# Altium footprint library Horizont_11_12_2017.PcbLib: 257 footprints (part 2 of 17)
Each footprint in its own frame and in the unit in brackets; x right, y up, seen from the top. Pads: shape width x height; smd on the part's side, far side on the other; paste and mask are expansions set on the pad; w line width, h text height; cw(c..) or ccw(c..) is an arc to the next point about the centre after c.
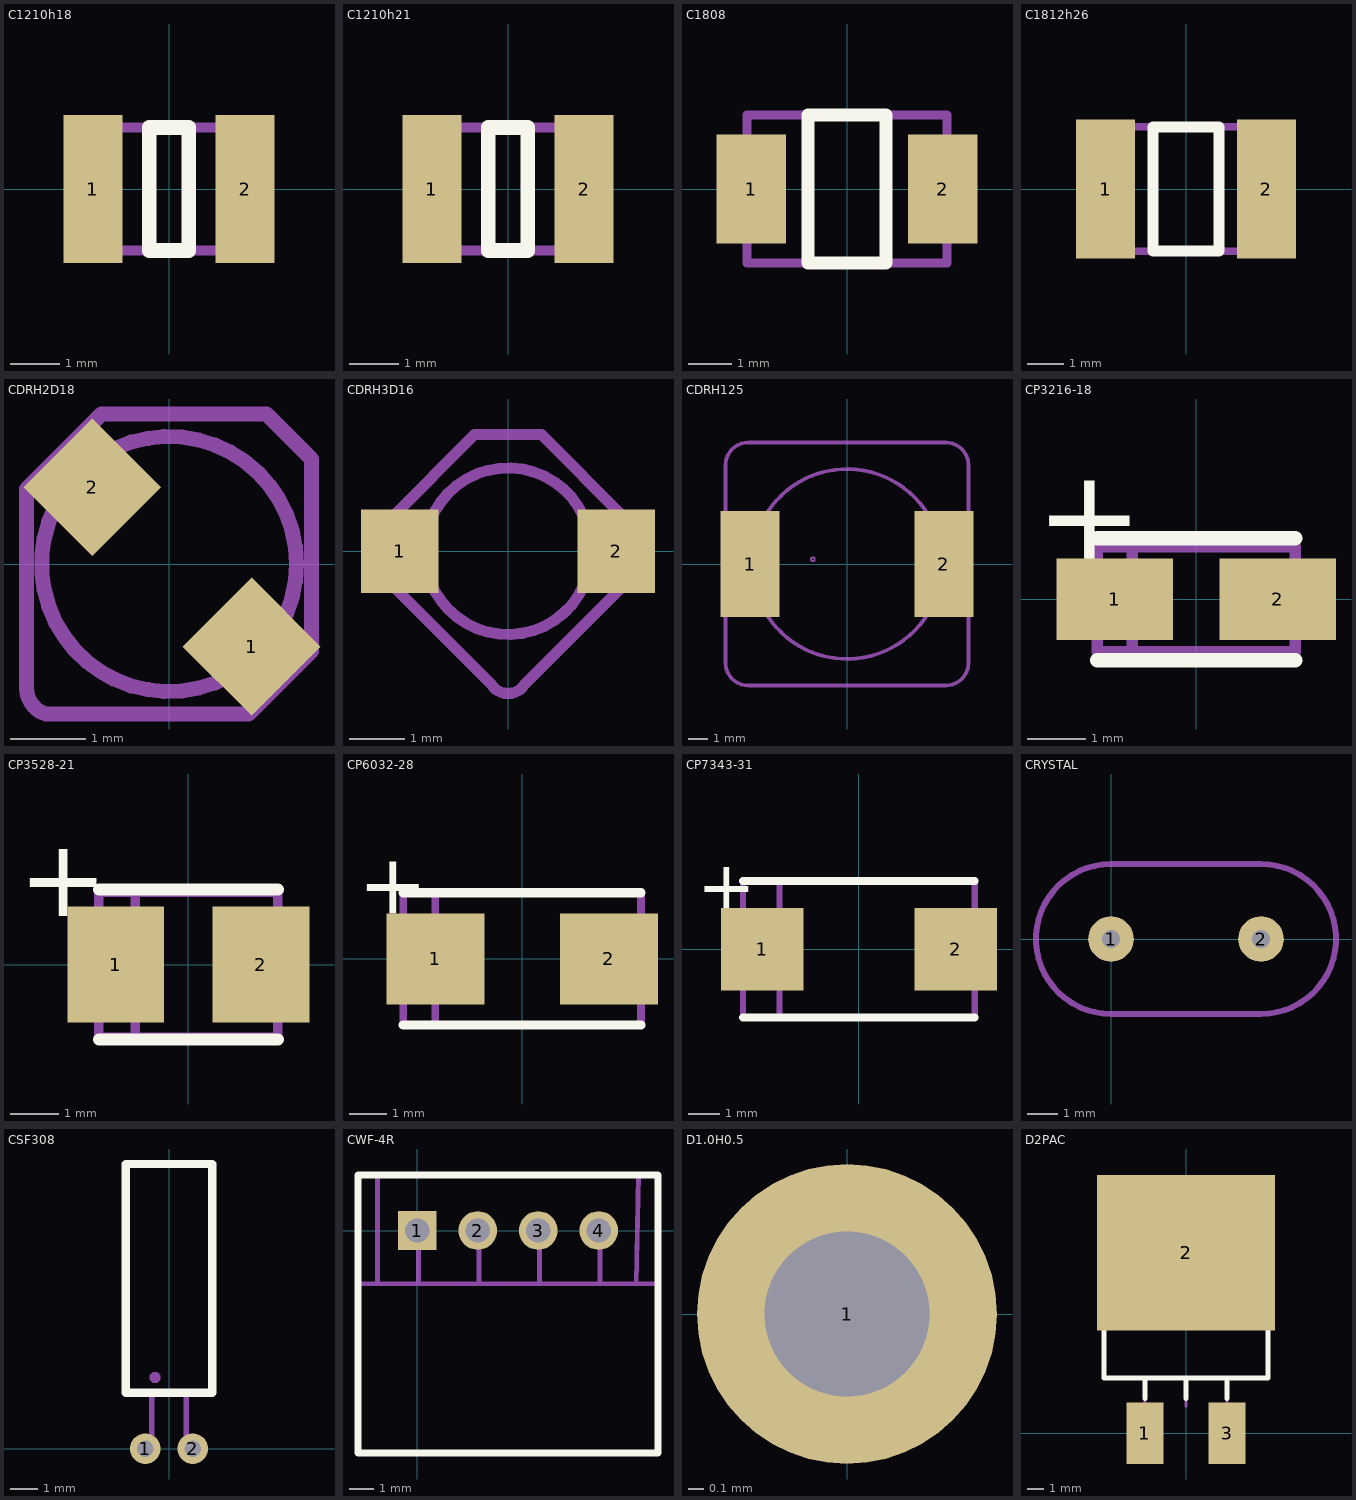
[diagram p1: the footprints below, top view; thin cyan lines are the x and y axes]

## C1210h18 [mm]
height 1.8
pads (2):
  rect 1.2x3 smd: 1(-1.55,0) 2(1.55,0)
Top Overlay:
  lines w0.3: -0.4,-1.25 -0.4,1.25 0.4,1.25 0.4,-1.25 -0.4,-1.25
Mechanical 1:
  circle w0.1: c-1.1,0 r0.1
  lines w0.2: -1.6,-1.25 -1.6,1.25 1.6,1.25 1.6,-1.25 -1.6,-1.25
  text ".Designator" at -0.87,-0.4 h1.5
3D body "C1210h18.stp": height 1.8, standoff 0, extent -1.675,-1.325 1.675,1.325

## C1210h21 [mm]
height 2.1
pads (2):
  rect 1.2x3 smd: 1(-1.55,0) 2(1.55,0)
Top Overlay:
  lines w0.3: -0.4,-1.25 -0.4,1.25 0.4,1.25 0.4,-1.25 -0.4,-1.25
Mechanical 1:
  circle w0.1: c-1.15,0 r0.1
  lines w0.2: -1.6,-1.25 -1.6,1.25 1.6,1.25 1.6,-1.25 -1.6,-1.25
  text ".Designator" at -1.22,-0.4 h1.5
3D body "C1210h21.stp": height 2.1, standoff 0, extent -1.675,-1.325 1.675,1.325

## C1808 [mm]
height 2.6
pads (2):
  rect 1.6x2.5 smd: 1(-2.2,0) 2(2.2,0)
Top Overlay:
  lines w0.3: -0.9,-1.7 -0.9,1.7 0.9,1.7 0.9,-1.7 -0.9,-1.7
Mechanical 1:
  circle w0.1: c-1.85,0 r0.1
  lines w0.2: -2.3,-1.7 -2.3,1.7 2.3,1.7 2.3,-1.7 -2.3,-1.7
  text ".Designator" at -1.57,-0.4 h1.5
3D body "User Library-cap_1808_low.STEP": height 1.35, standoff 0, extent -2.325,-0.975 2.275,1.025

## C1812h26 [mm]
height 2.6
pads (2):
  rect 1.6x3.8 smd: 1(-2.2,0) 2(2.2,0)
Top Overlay:
  lines w0.3: -0.9,-1.7 -0.9,1.7 0.9,1.7 0.9,-1.7 -0.9,-1.7
Mechanical 1:
  circle w0.1: c-1.85,0 r0.1
  lines w0.2: -2.3,-1.7 -2.3,1.7 2.3,1.7 2.3,-1.7 -2.3,-1.7
  text ".Designator" at -1.57,-0.4 h1.5
3D body "C1812h26.stp": height 2.6, standoff 0, extent -2.35,-1.7 2.35,1.7

## CDRH2D18 [mm]
pads (2):
  rect 1.3x1.3 smd rot 135: 1(1.1,-1.1) 2(-1.021,1.021)
Mechanical 1:
  circle w0.2: c0,0 r1.7
  lines w0.2: -1.9,-1.659 ccw(c-1.559,-1.659) -1.8,-1.9 -1.771,-1.929 ccw(c-1.6,-1.759) -1.6,-2 1.059,-2 1.9,-1.159 1.9,1.4 1.3,2 -0.9,2 -1.9,1 -1.9,-1.659
3D body "User Library-CDRH2D18-1.step": height 2, standoff -0.05, extent -1.575,-1.6 1.625,1.6

## CDRH3D16 [mm]
height 1.8
pads (2):
  rect 1.4x1.5 smd: 1(-1.95,0) 2(1.95,0)
Mechanical 1:
  circle w0.1: c-1.8,0.25 r0.1
  circle w0.2: c0,0 r1.5
  lines w0.2: -2.1,-0.6 -2.1,0.6 -0.6,2.1 0.6,2.1 2.1,0.6 2.1,-0.6 0.3,-2.4 cw(c0,-2.2) -0.3,-2.4 -2.1,-0.6
  text ".Designator" at -4.2,-0.2 h1.5
  text ".Comment" at 0.5,-4.5 h1.5
3D body "CDRH3D16.stp": height 1.8, standoff 0, extent -2.263,-2.48 2.263,2.263

## CDRH125 [mm]
height 8
pads (2):
  rect 3.1x5.6 smd: 1(-5.1,0) 2(5.1,0)
Mechanical 1:
  circle w0.2: c0,0 r5
  circle w0.1: c-1.8,0.25 r0.1
  lines w0.2: 6.4,5.2 ccw(c5.2,5.2) 5.2,6.4 -5.2,6.4 ccw(c-5.2,5.2) -6.4,5.2 -6.4,-5.2 ccw(c-5.2,-5.2) -5.2,-6.4 5.2,-6.4 ccw(c5.2,-5.2) 6.4,-5.2 6.4,5.233
  text ".Designator" at -1.73,2.2 h1.5
  text ".Comment" at -3.1,-1.8 h1.5
3D body "B82477.stp": height 8, standoff 0, extent -6.4,-6.4 6.4,6.4

## CP3216-18 [mm]
height 1.8
pads (2):
  rect 2x1.4 smd: 1(-1.4,0) 2(1.4,0)
Top Overlay:
  lines w0.25: -1.7,-1.05 1.7,-1.05 ; -1.7,1.05 1.7,1.05
  text "+" at -2.75,0.65 h1.61
Mechanical 1:
  lines w0.2: -1.1,-0.9 -1.1,0.9 ; -1.7,-0.9 1.7,-0.9 1.7,0.9 -1.7,0.9 -1.7,-0.9
  text "+" at -0.9,-0.45 h1.5
  text ".Designator" at -1.3,1.18 h1.5
3D body "CP3216h18.stp": height 1.9, standoff 0, extent -1.9,-0.9 1.9,0.9

## CP3528-21 [mm]
height 2.1
pads (2):
  rect 2x2.4 smd: 1(-1.5,0) 2(1.5,0)
Top Overlay:
  lines w0.25: -1.85,-1.55 1.85,-1.55 ; -1.85,1.55 1.85,1.55
  text "+" at -3.5,1 h1.61
Mechanical 1:
  lines w0.2: -1.1,-1.5 -1.1,1.5 ; -1.85,-1.5 -1.85,1.5 1.85,1.5 1.85,-1.5 -1.85,-1.5
  text ".Designator" at -1.53,1.81 h1.5
  text "+" at -0.9,-0.45 h1.5
3D body "CP3528h21.stp": height 2.2, standoff 0, extent -2.05,-1.5 2.05,1.5

## CP6032-28 [mm]
height 2.8
pads (2):
  rect 2.6x2.4 smd: 1(-2.3,0) 2(2.3,0)
Top Overlay:
  lines w0.25: -3.15,-1.75 3.15,-1.75 ; -3.15,1.75 3.15,1.75
  text "+" at -4.35,1.2 h1.61
Mechanical 1:
  lines w0.2: -2.3,-1.75 -2.3,1.75 ; -3.15,-1.75 -3.15,1.75 3.15,1.75 3.15,-1.75 -3.15,-1.75
  text "+" at -2.05,-0.45 h1.5
  text ".Designator" at -0.88,-0.36 h1.5
3D body "CP6032h28.stp": height 2.9, standoff 0, extent -3.45,-1.75 3.45,1.75

## CP7343-31 [mm]
height 3.1
pads (2):
  rect 2.6x2.6 smd: 1(-3.05,0) 2(3.05,0)
Top Overlay:
  lines w0.25: -3.65,-2.15 3.65,-2.15 ; -3.65,2.15 3.65,2.15
  text "+" at -5.1,1.2 h1.61
Mechanical 1:
  lines w0.2: -2.5,-2 -2.5,2 ; -3.65,-2.15 3.65,-2.15 3.65,2.15 -3.65,2.15 -3.65,-2.15
  text ".Designator" at -0.93,-0.44 h1.5
  text "+" at -1.95,-0.45 h1.5
3D body "CP7343h31.stp": height 3.2, standoff 0, extent -4.1,-2.3 4.1,2.3

## CRYSTAL [mil]
pads (2):
  round 60 hole 23.62: 1(0,0) 2(196.85,0)
Mechanical 1:
  lines w7.87: 0,-98.43 cw(c0,0) 0,98.43 196.85,98.43 cw(c196.85,0) 196.85,-98.43 0,-98.43

## CSF308 [mm]
height 3.1
pads (2):
  round 1.1 hole 0.6 unplated: 1(-0.85,0) 2(0.85,0)
Top Overlay:
  lines w0.3: -1.55,2 -1.55,10.2 1.55,10.2 1.55,2 -1.55,2
Mechanical 1:
  circle w0.2: c-0.5,2.55 r0.1
  lines w0.2: -0.625,0.05 -0.625,2 ; 0.625,0 0.625,2 ; -1.55,2 1.55,2 1.55,10.2 -1.55,10.2 -1.55,2
  text ".Designator" at 0.39,4 h1.5
3D body "CSF308.stp": height 2.55, standoff -3, extent -1.55,-0.15 1.538,10.2

## CWF-4R [mm]
height 5.7
pads (4):
  rect 1.6x1.6 hole 1: 1(0,0)
  round 1.6 hole 1: 2(2.5,0) 3(5,0) 4(7.5,0)
Top Overlay:
  lines w0.3: -2.45,-9.2 -2.45,2.3 9.95,2.3 9.95,-9.2 -2.45,-9.2
Mechanical 1:
  lines w0.2: -1.65,-2.2 -1.65,2.3 -2.45,2.3 -2.45,-2.2 ; -0.05,0 0,0 ; 0.05,-2.2 0.05,0 ; 2.45,0 2.5,0 ; 2.55,-2.2 2.55,0 ; 4.95,0 5,0 ; 5.05,-2.2 5.05,0 ; 7.45,0 7.5,0 ; 7.55,-2.2 7.55,0 ; 9.05,-2.2 9.15,2.3 9.95,2.3 9.95,-2.2 ; -2.45,-2.2 -2.45,-9.2 9.95,-9.2 9.95,-2.2 ; -2.45,-2.2 9.95,-2.2
  text ".Designator" at 1.95,-5.5 h1.5
  text "4" at 7.2,-3.5 h1.5
  text "1" at -0.1,-3.6 h1.5
3D body "CWF-4R.STEP": height 6.1, standoff -2, extent -2.45,-9.2 9.95,2.3

## D1.0H0.5 [mm]
pads (1):
  round 2 hole 1.1: 1(0,0)
Mechanical 1:
  lines w0.2: -0.6,-0.6 0.6,-0.6 0.6,0.6 -0.6,0.6 -0.6,-0.6

## D2PAC [mm]
height 2.38
pads (3):
  rect 2.32x3.81 smd: 1(-2.54,0) 3(2.54,0)
  rect 11x9.65 smd: 2(0,11.176)
Top Overlay:
  lines w0.3: -5.08,6.477 -5.08,3.429 5.08,3.429 5.08,6.477 ; -2.54,2.159 -2.54,3.429 ; 0,2.159 0,3.429 ; 2.54,2.159 2.54,3.429
Mechanical 1:
  lines w0.2: -4.826,12.7 -4.826,13.081 -3.937,13.97 3.937,13.97 4.826,13.081 4.826,12.7 ; -2.54,-0.254 -2.54,3.429 ; 0,1.651 0,3.429 ; 2.54,-0.254 2.54,3.429 ; -5.08,3.429 -5.08,12.7 5.08,12.7 5.08,3.429 -5.08,3.429
  text ".Designator" at -3.048,8.255 h1.5
  text ".Comment" at -2.921,5.715 h1.5
  text "2" at -0.254,4.064 h1.5
  text "1" at -2.667,4.064 h1.5
  text "3" at 2.286,4.064 h1.5
3D body "D2PAC.STEP": height 4.5, standoff -0.01, extent -5.08,-0.508 5.08,13.869